# Altium schematic symbol library GN-1846-E-V2_Library.SchLib: 99 symbols (part 2 of 7)
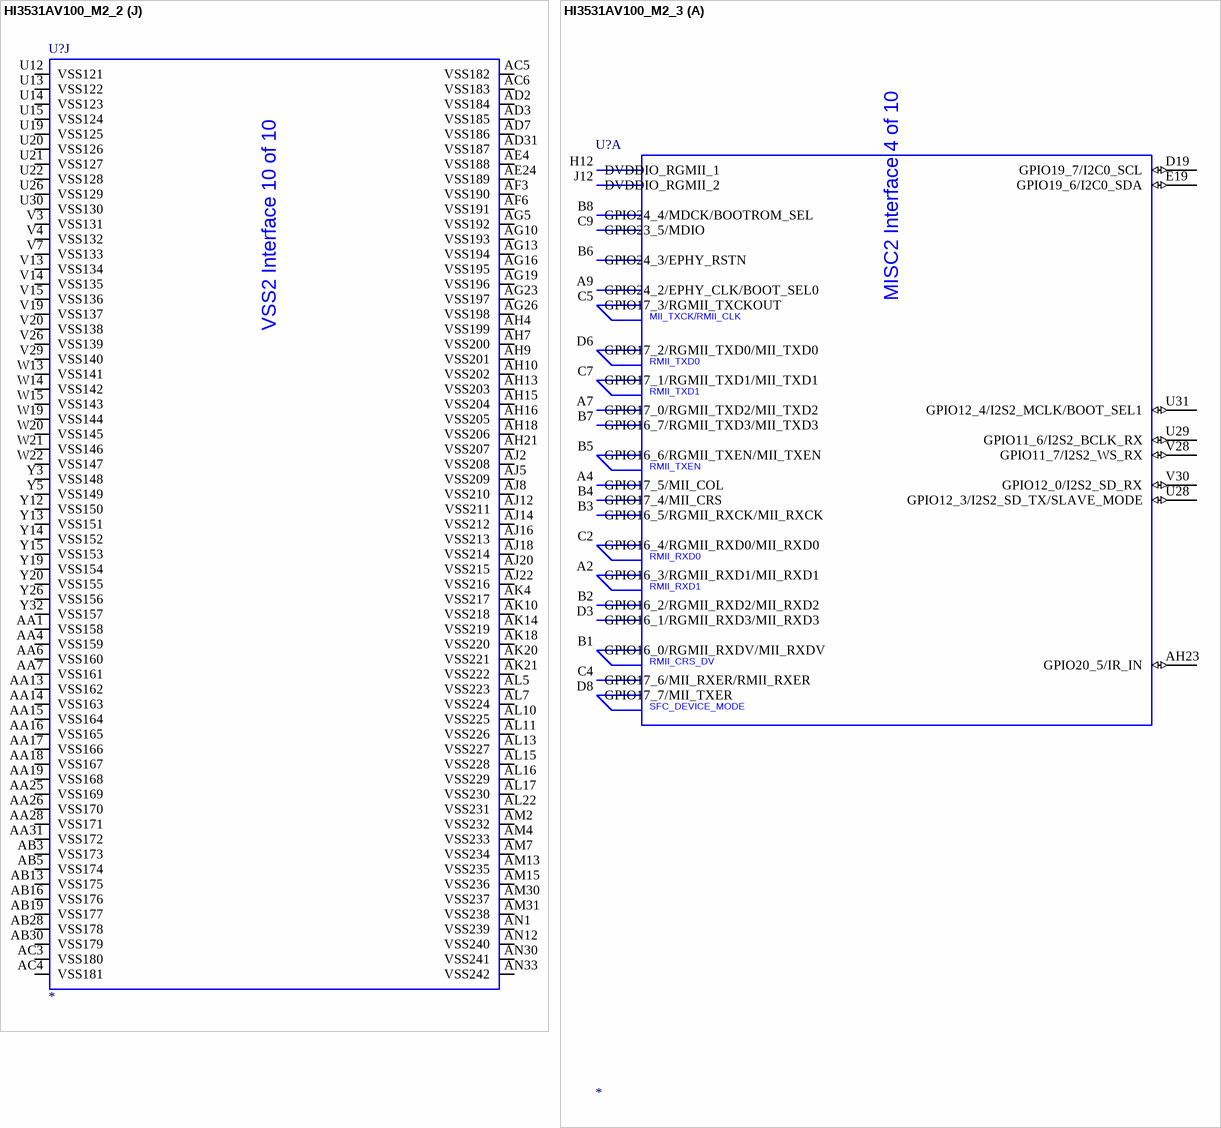
[diagram p78: symbols HI3531AV100_M2_2 to HI3531AV100_M2_3]

## HI3531AV100_M2_2
designator U?
PARTS: 1; OriginalSymbolOrigin: (30,630); LEVEL: STD; DEVICE: HI3531AV100; HETERO: (HI3531AV100_DDR1),(HI3531AV100_DDR2),(HI3531AV100_SYSTEM),(HI3531AV100_AD),(HI3531AV100_VO),(HI3531AV100_M1),(HI3531AV100_M2),(HI3531AV100_POWER),(HI3531AV100_VSS1),(HI3531AV100_VSS2); FORWARD_PCB: 1
part A pins: A2 GPIO16_3/RGMII_RXD1/MII_RXD1 (io), A4 GPIO17_5/MII_COL (io), A7 GPIO17_0/RGMII_TXD2/MII_TXD2 (io), A9 GPIO24_2/EPHY_CLK/BOOT_SEL0 (io), AH23 GPIO20_5/IR_IN (io), B1 GPIO16_0/RGMII_RXDV/MII_RXDV (io), B2 GPIO16_2/RGMII_RXD2/MII_RXD2 (io), B3 GPIO16_5/RGMII_RXCK/MII_RXCK (io), B4 GPIO17_4/MII_CRS (io), B5 GPIO16_6/RGMII_TXEN/MII_TXEN (io), B6 GPIO24_3/EPHY_RSTN (io), B7 GPIO16_7/RGMII_TXD3/MII_TXD3 (io), B8 GPIO24_4/MDCK/BOOTROM_SEL (io), C2 GPIO16_4/RGMII_RXD0/MII_RXD0 (io), C4 GPIO17_6/MII_RXER/RMII_RXER (io), C5 GPIO17_3/RGMII_TXCKOUT (io), C7 GPIO17_1/RGMII_TXD1/MII_TXD1 (io), C9 GPIO23_5/MDIO (io), D3 GPIO16_1/RGMII_RXD3/MII_RXD3 (io), D6 GPIO17_2/RGMII_TXD0/MII_TXD0 (io), D8 GPIO17_7/MII_TXER (io), D19 GPIO19_7/I2C0_SCL (io), E19 GPIO19_6/I2C0_SDA (io), H12 DVDDIO_RGMII_1 (io), J12 DVDDIO_RGMII_2 (io), U28 GPIO12_3/I2S2_SD_TX/SLAVE_MODE (io), U29 GPIO11_6/I2S2_BCLK_RX (io), U31 GPIO12_4/I2S2_MCLK/BOOT_SEL1 (io), V28 GPIO11_7/I2S2_WS_RX (io), V30 GPIO12_0/I2S2_SD_RX (io)
part B pins: A13 HDMI_TX1P (io), A15 HDMI_TXCP (io), A16 AVSS_HDMITX1 (io), A17 VGA_G (io), A18 VGA_B (io), A21 GPIO10_4/VOU1120_DAT12 (io), A22 GPIO10_2/VOU1120_DAT10 (io), AJ24 GPIO23_7/UART3_TXD (io), AK25 GPIO23_6/UART3_RXD (io), B13 HDMI_TX1N (io), B15 HDMI_TXCN (io), B16 AVSS_HDMITX2 (io), B17 VGA_R (io), B18 AVSS_VDAC1 (io), B20 GPIO10_7/VOU1120_DAT15 (io), B21 GPIO10_5/VOU1120_DAT13 (io), B22 GPIO10_1/VOU1120_DAT9 (io), B23 GPIO10_0/VOU1120_DAT8 (io), C12 HDMI_TX2P (io), C13 AVSS_HDMITX3 (io), C14 HDMI_TX0P (io), C15 AVSS_HDMITX4 (io), C16 GPIO14_4/HDMI_HOTPLUG (io), C18 CVBS_OUT (io), C19 AVSS_VDAC2 (io), C20 GPIO10_6/VOU1120_DAT14 (io), C21 GPIO10_3/VOU1120_DAT11 (io), C23 GPIO20_7/VOU1120_CLK (io), D12 HDMI_TX2N (io), D13 AVSS_HDMITX5 (io), D14 HDMI_TX0N (io), D15 AVSS_HDMITX6 (io), D16 GPIO14_6/HDMI_SDA (io), D17 GPIO24_0/VGA_HS (io), D18 AVSS_VDAC3 (io), D20 GPIO9_7/VOU1120_DAT7/UART1_TXD (io), D22 GPIO9_1/VOU1120_DAT1/UART0_TXD (io), D23 GPIO9_0/VOU1120_DAT0/UART0_RXD (io), D24 GPIO12_7/I2S3_SD_TX (io), E2 GPIO0_1/VOU_SLV_DAT1 (io), E3 GPIO0_6/VOU_SLV_CLK (io), E12 AVSS_HDMITX7 (io), E13 AVSS_HDMITX8 (io), E14 AVSS_HDMITX9 (io), E15 GPIO14_5/HDMI_CEC (io), E16 GPIO14_7/HDMI_SCL (io), E17 GPIO24_1/VGA_VS (io), E18 AVSS_VDAC4 (io), E20 GPIO9_6/VOU1120_DAT6/UART1_RXD (io), E21 GPIO9_5/VOU1120_DAT5/UART1_CTSN (io), E22 GPIO9_2/VOU1120_DAT2/UART2_RXD (io), E23 GPIO9_3/VOU1120_DAT3/UART2_TXD (io), E24 GPIO12_6/I2S3_WS_TX (io), F1 GPIO13_7/VOU_SLV_DAT3 (io), F2 UART0_TXD/VOU_SLV_DAT4/GPIO18_1 (io), F3 GPIO0_7/VOU_SLV_DAT2 (io), F18 VDAC_REXT (io), F22 GPIO9_4/VOU1120_DAT4/UART1_RTSN (io), F24 GPIO12_5/I2S3_BCLK_TX (io), G1 UART0_RXD/VOU_SLV_DAT5/GPIO18_0 (io), G2 GPIO18_5/VOU_SLV_DAT6/UART1_TXD (io), G3 GPIO0_2/VOU_SLV_DAT0 (io), H2 GPIO18_4/VOU_SLV_DAT7/UART1_RXD (io), H3 GPIO0_3/VOU_SLV_DAT9 (io), H15 AVSS_HDMITX10 (io), H16 AVSS_HDMITX11 (io), H18 AVSS_VDAC5 (io), H19 AVSS_VDAC6 (io), H20 DVSS_VDAC (io), J1 GPIO18_7/VOU_SLV_DAT13 (io), J2 GPIO18_6/VOU_SLV_DAT12 (io), J3 GPIO18_3/VOU_SLV_DAT10 (io), J15 AVDD33_HDMITX (io), J16 AVCC11_HDMITX (io), J18 AVSS_VDAC_0 (io), J19 AVDD33_VDAC (io), J20 DVDD33_VDAC (io), K1 GPIO0_0/VOU_SLV_DAT15 (io), K2 GPIO0_4/VOU_SLV_DAT14 (io), K3 GPIO18_2/VOU_SLV_DAT11 (io), L3 GPIO0_5/VOU_SLV_DAT8 (io)
part C pins: A24 VI0_DAT0/GPIO1_0 (io), A25 VI0_DAT2/GPIO1_2 (io), A27 VI1_DAT2/GPIO2_2 (io), A28 VI2_CLK/GPIO21_3/VI_ADC_REFCLK1 (io), A29 VI2_DAT1/GPIO3_1 (io), A30 VI2_DAT3/GPIO3_3 (io), A31 VI2_DAT5/GPIO3_5 (io), A32 VI3_CLK/GPIO21_4/VI2_CLK (io), B24 VI0_CLK/GPIO21_0/VI_ADC_REFCLK0 (io), B25 VI0_DAT3/GPIO1_3 (io), B26 VI1_CLK/GPIO21_1/VI0_CLK (io), B27 VI1_DAT1/GPIO2_1 (io), B29 VI2_DAT0/GPIO3_0 (io), B30 VI2_DAT4/GPIO3_4 (io), B31 VI2_DAT6/GPIO3_6 (io), B32 VI3_DAT1/GPIO4_1 (io), B33 VI3_DAT2/GPIO4_2 (io), C25 VI0_DAT1/GPIO1_1 (io), C27 VI1_DAT0/GPIO2_0 (io), C28 GPIO21_2/VI_ADC_REFCLK0/VI1_CLK (io), C30 VI2_DAT2/GPIO3_2 (io), C31 VI3_DAT0/GPIO4_0 (io), C32 VI3_DAT3/GPIO4_3 (io), C33 VI3_DAT4/GPIO4_4 (io), D25 VI0_DAT4/GPIO1_4 (io), D27 VI1_DAT4/GPIO2_4 (io), D28 VI1_DAT6/GPIO2_6 (io), D29 VI2_DAT7/GPIO3_7 (io), D30 GPIO11_1/I2S0_WS_RX (io), D31 VI3_DAT5/GPIO4_5 (io), D32 VI3_DAT6/GPIO4_6 (io), E25 VI0_DAT5/GPIO1_5 (io), E26 VI0_DAT6/GPIO1_6 (io), E27 VI1_DAT3/GPIO2_3 (io), E28 VI1_DAT7/GPIO2_7 (io), E29 GPIO11_2/I2S0_SD_RX (io), E31 VI3_DAT7/GPIO4_7 (io), E32 GPIO21_5/VI_ADC_REFCLK1/VI3_CLK (io), F26 VI0_DAT7/GPIO1_7 (io), F27 VI1_DAT5/GPIO2_5 (io), F28 GPIO11_0/I2S0_BCLK_RX (io), F29 VI4_DAT1/GPIO5_1 (io), F30 VI4_DAT0/GPIO5_0 (io), F31 VI4_CLK/GPIO21_6/VI_ADC_REFCLK2 (io), F32 VI4_DAT5/GPIO5_5 (io), F33 VI4_DAT4/GPIO5_4 (io), G28 VI4_DAT2/GPIO5_2 (io), G29 VI4_DAT3/GPIO5_3 (io), G30 VI5_DAT0/GPIO6_0 (io), G32 VI4_DAT6/GPIO5_6 (io), H29 VI5_DAT1/GPIO6_1 (io), H30 VI5_DAT2/GPIO6_2 (io), H31 VI4_DAT7/GPIO5_7 (io), H32 VI5_CLK/GPIO21_7/VI4_CLK (io), J28 VI5_DAT3/GPIO6_3 (io), J29 VI5_DAT4/GPIO6_4 (io), J30 VI5_DAT5/GPIO6_5 (io), J31 GPIO12_1/VI_ADC_REFCLK2/VI5_CLK (io), J32 VI5_DAT7/GPIO6_7 (io), J33 VI5_DAT6/GPIO6_6 (io), K25 DVDD3318_VI_1 (io), K28 GPIO11_3/I2S1_BCLK_RX (io), K29 GPIO11_4/I2S1_WS_RX (io), K32 VI6_CLK/GPIO12_2/VI_ADC_REFCLK3 (io), L25 DVDD3318_VI_2 (io), L29 GPIO11_5/I2S1_SD_RX (io), L30 VI6_DAT0/GPIO7_0 (io), L31 VI6_DAT4/GPIO7_4 (io), L32 VI6_DAT6/GPIO7_6 (io), L33 VI6_DAT5/GPIO7_5 (io), M25 DVDD3318_VI_3 (io), M28 VI6_DAT1/GPIO7_1 (io), M29 VI6_DAT2/GPIO7_2 (io), M32 VI7_CLK/GPIO15_7/VI6_CLK (io), M33 VI6_DAT7/GPIO7_7 (io), N25 DVDD3318_VI_4 (io), N28 VI6_DAT3/GPIO7_3 (io), N29 VI7_DAT0/GPIO8_0 (io), N30 VI7_DAT1/GPIO8_1 (io), N31 VI7_DAT5/GPIO8_5 (io), N32 VI7_DAT6/GPIO8_6 (io), P25 DVDD3318_VI_5 (io), P28 VI7_DAT4/GPIO8_4 (io), P29 VI7_DAT2/GPIO8_2 (io), P30 VI7_DAT3/GPIO8_3 (io), P31 VI7_DAT7/GPIO8_7 (io), P33 GPIO20_6/VI_ADC_REFCLK3/VI7_CLK (io), R25 DVDD3318_VI_6 (io), R29 SPI_CSN0/PCIE_SATA_MODE0 (io), R31 GPIO13_0/SPI_SCLK/I2C1_SCL (io), R32 GPIO13_2/SPI_SDI (io), R33 TEST_CLK/SPI_SDO/I2C1_SDA (io), T28 SPI_CSN3/PCIE_SATA_MODE3 (io), T29 SPI_CSN1/PCIE_SATA_MODE1 (io), T30 SPI_CSN2/PCIE_SATA_MODE2 (io)
part D pins: A10 GPIO14_0/USB2_OVRCUR (io), A11 USB2_DP (io), AA20 AVSS_SATA0_1 (io), AA21 AVSS_SATA2_1 (io), AA22 AVDD_SATA2 (io), AB20 AVDD_SATA0 (io), AB21 AVDD_SATA1 (io), AB22 AVSS_SATA1_1 (io), AC25 AVDD33_SATA3 (io), AC26 AVSS_SATA3_2 (io), AD22 AVDD33_SATA0 (io), AD23 AVDD33_SATA1 (io), AD25 AVDD33_SATA2 (io), AD26 AVSS_SATA2_2 (io), AE22 AVSS_SATA0_2 (io), AE23 AVSS_SATA1_2 (io), AE29 AVSS_SATA3_3 (io), AE30 AVSS_SATA3_4 (io), AF28 AVSS_SATA3_5 (io), AF29 SATA_TX3P/PCIE0_TX0P (io), AF30 SATA_TX3M/PCIE0_TX0M (io), AF31 AVSS_SATA3_6 (io), AF32 SATA_RX3P/PCIE0_RX0P (io), AF33 SATA_RX3M/PCIE0_RX0M (io), AG24 AVDD33_USB3 (io), AG25 AVSS_USB3_1 (io), AG28 AVSS_SATA2_3 (io), AG29 AVSS_SATA2_4 (io), AG30 AVSS_SATA2_5 (io), AH25 USB3_REXT (io), AH26 GPIO14_3/USB3_PWREN (io), AH27 GPIO14_2/USB3_OVRCUR (io), AH28 AVSS_SATA1_3 (io), AH29 SATA_TX2P/PCIE1_TX0P/PCIE0_TX1P (io), AH30 SATA_TX2M/PCIE1_TX0M/PCIE0_TX1M (io), AH31 AVSS_SATA2_6 (io), AH32 SATA_RX2P/PCIE1_RX0P/PCIE0_RX1P (io), AH33 SATA_RX2M/PCIE1_RX0M/PCIE0_RX1M (io), AJ25 AVSS_SATA0_3 (io), AJ26 SATA_TX0P/PCIE1_TX1P/USB3_TXP (io), AJ27 AVSS_SATA0_4 (io), AJ28 SATA_TX1P/PCIE1_TX0P (io), AJ29 AVSS_SATA1_4 (io), AJ30 AVSS_SATA2_7 (io), AK26 SATA_TX0M/PCIE1_TX1M/USB3_TXM (io), AK27 AVSS_SATA0_5 (io), AK28 SATA_TX1M/PCIE1_TX0M (io), AK29 AVSS_SATA1_5 (io), AK30 AVSS_SATA2_8 (io), AK31 AVSS_SATA2_9 (io), AK32 PCIE_REFCLK0P (io), AK33 PCIE_REFCLK0M (io), AL24 AVSS_USB3_2 (io), AL26 AVSS_SATA0_6 (io), AL28 AVSS_SATA1_6 (io), AL30 PCIE_REFCLK1P (io), AL31 PCIE_REFCLK1M (io), AM24 USB3_DP (io), AM26 SATA_RX0P/PCIE1_RX1P/USB3_RXP (io), AM28 SATA_RX1P/PCIE1_RX0P (io), AM32 GPIO15_2/SATA_LED_N2 (io), AM33 GPIO15_3/SATA_LED_N3 (io), AN24 USB3_DM (io), AN26 SATA_RX0M/PCIE1_RX1M/USB3_RXM (io), AN28 SATA_RX1M/PCIE1_RX0M (io), AN31 GPIO15_0/SATA_LED_N0 (io), AN32 GPIO15_1/SATA_LED_N1 (io), B10 GPIO14_1/USB2_PWREN (io), B11 USB2_DM (io), C11 AVSS_USB2_1 (io), D10 AVSS_USB2_2 (io), D11 USB2_REXT (io), H14 AVSS_USB2_3 (io), J14 AVDD33_USB2 (io), Y21 AVSS_SATA3_1 (io), Y22 AVDD_SATA3 (io)
part E pins: AA29 RSTN (io), AA30 NF_DQ0/VI8_DAT14/GPIO22_0 (io), AA32 XIN (io), AA33 XOUT (io), AB25 AVDD33_RTC (io), AB26 AVSS_RTC1 (io), AB29 WDG_RSTN/SYS_RSTN_OUT (io), AB31 RTC_XIN (io), AB32 RTC_XOUT (io), AC28 SFC_HOLD_IO3/GPIO19_3 (io), AC29 SFC_DOI/GPIO19_2 (io), AC30 SFC_WP_IO2/GPIO19_1 (io), AC31 AVSS_RTC2 (io), AC32 AVSS_RTC3 (io), AD28 AVSS_RTC4 (io), AD29 SFC_CLK/GPIO24_5/SFC_BOOT_MODE (io), AD30 SFC_DIO/GPIO19_0 (io), AD32 SFC_CS1N/GPIO19_5 (io), AD33 SFC_CS0N/GPIO19_4 (io), AE28 AVDD_BAT (io), AG27 AVDD_EFUSE (io), AH22 TEST_MODE (io), AH24 POR_ENABLE (io), AJ23 JTAG_TRSTN/GPIO20_0 (io), AK22 JTAG_EN (io), AK23 JTAG_TCK/GPIO20_1 (io), AK24 JTAG_TDI/GPIO20_4 (io), AL23 JTAG_TMS/GPIO20_2 (io), AM23 JTAG_TDO/GPIO20_3 (io), C1 PWM_OUT0/GPIO15_4 (io), D1 PWM_OUT2/GPIO15_6 (io), D2 PWM_OUT1/GPIO15_5 (io), T32 NF_RDY1/VI8_CLK/GPIO23_2 (io), U32 NF_RDY0/VI8_DAT1/GPIO23_1 (io), U33 NF_REN/VI8_DAT2/GPIO13_5 (io), V31 NF_CLE/VI8_DAT5/GPIO13_3 (io), V32 NF_CSN0/VI8_DAT3/GPIO23_3 (io), V33 NF_CSN1/VI8_DAT4/GPIO23_4 (io), W28 NF_DQ7/VI8_DAT7/GPIO22_7 (io), W29 NF_DQ5/VI8_DAT9/GPIO22_5 (io), W30 NF_DQ4/VI8_DAT10/GPIO22_4 (io), W31 NF_DQ6/VI8_DAT8/GPIO22_6 (io), W32 NF_WEN/VI8_DAT0/GPIO13_6 (io), W33 NF_ALE/VI8_DAT6/GPIO13_4 (io), Y25 DVDDIO_SFC (io), Y28 NF_DQ1/VI8_DAT13/GPIO22_1 (io), Y29 NF_DQ3/VI8_DAT11/GPIO22_3 (io), Y30 NF_DQ2/VI8_DAT12/GPIO22_2 (io), Y31 GPIO23_0/VI8_DAT15 (io)
part F pins: AB14 AVDD_DDRPLL3 (io), AB15 AVSS_DDRPLL3 (io), AB17 AVDD_DDRPLL4 (io), AB18 AVSS_DDRPLL4 (io), AG8 VDDIO_DDR11 (io), AG9 VDDIO_DDR12 (io), AG11 VDDIO_DDR13 (io), AG12 VDDIO_DDR14 (io), AG14 VDDIO_DDR15 (io), AG15 VDDIO_CK_DDR1 (io), AG17 VDDIO_DDR16 (io), AG18 VDDIO_DDR17 (io), AG20 VDDIO_DDR18 (io), AG21 DDR1_ZQ (io), AH5 VDDIO_DDR19 (io), AH6 VDDIO_DDR20 (io), AH8 DDR1_DM0 (io), AH11 DDR1_DQ25 (io), AH12 DDR1_DQ17 (io), AH14 DDR1_DQ24 (io), AH17 DDR1_A0 (io), AH19 DDR1_A4 (io), AH20 DDR1_A8 (io), AJ6 DDR1_DQ6 (io), AJ7 DDR1_DQ7 (io), AJ9 DDR1_DQ10 (io), AJ10 DDR1_DQ20 (io), AJ11 DDR1_DQ16 (io), AJ13 DDR1_DQ19 (io), AJ15 DDR1_WE_N (io), AJ17 DDR1_A12 (io), AJ19 DDR1_A6 (io), AJ21 DDR1_A14 (io), AK5 DDR1_DQ2 (io), AK6 DDR1_DQ4 (io), AK7 DDR1_DQ1 (io), AK8 DDR1_DQ8 (io), AK9 DDR1_DQ14 (io), AK11 DDR1_DM3 (io), AK12 DDR1_DQ23 (io), AK13 DDR1_DM2 (io), AK15 DDR1_CAS_N (io), AK16 DDR1_A10 (io), AK17 DDR1_A15 (io), AK19 DDR1_A1 (io), AL3 DDR1_DQ13 (io), AL4 DDR1_DQ0 (io), AL6 DDR1_DQS1_N (io), AL8 DDR1_DQ22 (io), AL9 DDR1_DQ29 (io), AL12 DDR1_DQS3_N (io), AL14 DDR1_DQ30 (io), AL18 DDR1_ODT (io), AL19 DDR1_A11 (io), AL20 DDR1_A5 (io), AL21 DDR1_A7 (io), AM3 DDR1_DQ9 (io), AM5 DDR1_DQS0_N (io), AM6 DDR1_DQS1_P (io), AM8 DDR1_DQ3 (io), AM9 DDR1_DQ18 (io), AM10 DDR1_DQ31 (io), AM11 DDR1_DQS2_N (io), AM12 DDR1_DQS3_P (io), AM14 DDR1_DQ26 (io), AM16 DDR1_CLK_P (io), AM17 DDR1_CKE (io), AM18 DDR1_RAS_N (io), AM19 DDR1_A3 (io), AM20 DDR1_A2 (io), AM21 DDR1_RESET_N (io), AM22 DDR1_A13 (io), AN2 DDR1_DQ11 (io), AN3 DDR1_DQ15 (io), AN4 DDR1_DM1 (io), AN5 DDR1_DQS0_P (io), AN7 DDR1_DQ12 (io), AN8 DDR1_DQ5 (io), AN10 DDR1_DQ27 (io), AN11 DDR1_DQS2_P (io), AN14 DDR1_DQ28 (io), AN15 DDR1_DQ21 (io), AN16 DDR1_CLK_N (io), AN17 DDR1_BA1 (io), AN18 DDR1_CS_N (io), AN19 DDR1_BA2 (io), AN21 DDR1_A9 (io), AN22 DDR1_BA0 (io)
part G pins: AA2 DDR0_DQS3_P (io), AA3 DDR0_DQS3_N (io), AA5 DDR0_DM2 (io), AA12 AVDD_DDRPLL2 (io), AB2 DDR0_DQ26 (io), AB4 DDR0_DQ24 (io), AB6 DDR0_DQ19 (io), AB7 VDDIO_DDR5 (io), AB12 AVSS_DDRPLL2 (io), AC1 DDR0_DQ28 (io), AC2 DDR0_DQ30 (io), AC7 VDDIO_DDR6 (io), AD1 DDR0_DQ21 (io), AD4 DDR0_WE_N (io), AD5 DDR0_CAS_N (io), AD6 DDR0_A10 (io), AE1 DDR0_CLK_N (io), AE2 DDR0_CLK_P (io), AE3 DDR0_A0 (io), AE5 DDR0_A12 (io), AE6 DDR0_A15 (io), AE7 VDDIO_DDR7 (io), AF1 DDR0_BA1 (io), AF2 DDR0_CKE (io), AF4 DDR0_A4 (io), AF5 DDR0_A6 (io), AF7 VDDIO_DDR8 (io), AG1 DDR0_CS_N (io), AG2 DDR0_RAS_N (io), AG3 DDR0_A1 (io), AG4 DDR0_A11 (io), AG6 VDDIO_DDR9 (io), AG7 VDDIO_DDR10 (io), AH1 DDR0_BA2 (io), AH2 DDR0_ODT (io), AH3 DDR0_A3 (io), AJ1 DDR0_A5 (io), AJ3 DDR0_A8 (io), AJ4 DDR0_A14 (io), AK1 DDR0_A7 (io), AK2 DDR0_A2 (io), AK3 DDR0_A9 (io), AL1 DDR0_RESET_N (io), AL2 DDR0_BA0 (io), AM1 DDR0_A13 (io), M1 DDR0_DQ13 (io), M2 DDR0_DQ15 (io), M5 DDR0_DQ0 (io), M6 DDR0_DQ11 (io), N1 DDR0_DQ9 (io), N3 DDR0_DM1 (io), N4 DDR0_DQ6 (io), N5 DDR0_DQ2 (io), N7 DDR0_ZQ (io), P1 DDR0_DQS0_P (io), P2 DDR0_DQS0_N (io), P4 DDR0_DQ7 (io), P6 DDR0_DQ4 (io), P7 VDDIO_DDR1 (io), R2 DDR0_DQS1_P (io), R3 DDR0_DQS1_N (io), R4 DDR0_DM0 (io), R5 DDR0_DQ1 (io), T2 DDR0_DQ12 (io), T5 DDR0_DQ8 (io), T7 VDDIO_DDR2 (io), U1 DDR0_DQ14 (io), U3 DDR0_DQ5 (io), U4 DDR0_DQ10 (io), U6 DDR0_DQ3 (io), U7 VDDIO_DDR3 (io), V1 DDR0_DQ22 (io), V2 DDR0_DQ18 (io), V5 DDR0_DQ25 (io), V6 DDR0_DQ20 (io), V12 AVDD_DDRPLL1 (io), W2 DDR0_DQ27 (io), W3 DDR0_DQ29 (io), W4 DDR0_DQ31 (io), W5 DDR0_DQ16 (io), W6 DDR0_DM3 (io), W7 VDDIO_CK_DDR0 (io), W12 AVSS_DDRPLL1 (io), Y1 DDR0_DQS2_P (io), Y2 DDR0_DQS2_N (io), Y4 DDR0_DQ17 (io), Y6 DDR0_DQ23 (io), Y7 VDDIO_DDR4 (io)
part H pins: AD24 DVDD33_9 (io), AG22 DVDD33_10 (io), E7 DVDD33_1 (io), F5 DVDD_CPU1 (io), F6 DVDD_CPU2 (io), G5 DVDD_CPU3 (io), G6 DVDD_CPU4 (io), G7 DVDD_CPU5 (io), H5 DVDD_CPU6 (io), H6 DVDD_CPU7 (io), H7 DVDD_CPU8 (io), J5 DVDD_CPU9 (io), J6 DVDD_CPU10 (io), J7 DVDD_CPU11 (io), J13 DVDD33_2 (io), J17 DVDD33_3 (io), J21 DVDD33_4 (io), J22 DVDD33_5 (io), L7 DVDD33_6 (io), M12 DVDD_CPU12 (io), M13 DVDD_CPU13 (io), M16 DVDD_CORE1 (io), M17 DVDD_CORE2 (io), M18 DVDD_CORE3 (io), N12 DVDD_CPU14 (io), N13 DVDD_CPU15 (io), N16 DVDD_CORE4 (io), N17 DVDD_CORE5 (io), N18 DVDD_CORE6 (io), P16 DVDD_CORE7 (io), P17 DVDD_CORE8 (io), P18 DVDD_CORE9 (io), R16 DVDD_CORE10 (io), R17 DVDD_CORE11 (io), R18 DVDD_CORE12 (io), T16 DVDD_CORE13 (io), T17 DVDD_CORE14 (io), T18 DVDD_CORE15 (io), U16 DVDD_CORE16 (io), U17 DVDD_CORE17 (io), U18 DVDD_CORE18 (io), U25 DVDD33_7 (io), V16 DVDD_CORE19 (io), V17 DVDD_CORE20 (io), V18 DVDD_CORE21 (io), V21 AVSS_PLL1 (io), V22 AVDD11_PLL (io), V25 DVDD33_8 (io), W16 DVDD_CORE22 (io), W17 DVDD_CORE23 (io), W18 DVDD_CORE24 (io), W25 AVDD33_PLL (io), W26 AVSS_PLL2 (io), Y16 DVDD_CORE25 (io), Y17 DVDD_CORE26 (io), Y18 DVDD_CORE27 (io)
part I pins: A1 VSS1, A33 VSS2, B9 VSS3, B19 VSS4, B28 VSS5, C3 VSS6, C6 VSS7, C8 VSS8, C10 VSS9, C17 VSS10, C22 VSS11, C24 VSS12, C26 VSS13, C29 VSS14, D4 VSS15, D5 VSS16, D7 VSS17, D9 VSS18, D21 VSS19, D26 VSS20, E4 VSS21, E5 VSS22, E6 VSS23, E30 VSS24, E33 VSS25, F4 VSS26, F7 VSS27, F19 VSS28, F20 VSS29, F21 VSS30, F23 VSS31, F25 VSS32, G4 VSS33, G31 VSS34, H4 VSS35, H11 VSS36, H13 VSS37, H17 VSS38, H21 VSS39, H22 VSS40, H28 VSS41, H33 VSS42, J4 VSS43, J11 VSS44, K4 VSS45, K5 VSS46, K6 VSS47, K7 VSS48, K26 VSS49, K30 VSS50, K31 VSS51, L2 VSS52, L4 VSS53, L5 VSS54, L6 VSS55, L26 VSS56, L28 VSS57, M3 VSS58, M4 VSS59, M7 VSS60, M14 VSS61, M15 VSS62, M19 VSS63, M20 VSS64, M21 VSS65, M22 VSS66, M26 VSS67, M30 VSS68, M31 VSS69, N2 VSS70, N6 VSS71, N14 VSS72, N15 VSS73, N19 VSS74, N20 VSS75, N21 VSS76, N22 VSS77, N26 VSS78, P3 VSS79, P5 VSS80, P12 VSS81, P13 VSS82, P14 VSS83, P15 VSS84, P19 VSS85, P20 VSS86, P21 VSS87, P22 VSS88, P26 VSS89, P32 VSS90, R1 VSS91, R6 VSS92, R7 VSS93, R12 VSS94, R13 VSS95, R14 VSS96, R15 VSS97, R19 VSS98, R20 VSS99, R21 VSS100, R22 VSS101, R26 VSS102, R28 VSS103, R30 VSS104, T3 VSS105, T4 VSS106, T6 VSS107, T12 VSS108, T13 VSS109, T14 VSS110, T15 VSS111, T19 VSS112, T20 VSS113, T21 VSS114, T22 VSS115, T25 VSS116, T26 VSS117, T31 VSS118, U2 VSS119, U5 VSS120
part J pins: AA1 VSS158, AA4 VSS159, AA6 VSS160, AA7 VSS161, AA13 VSS162, AA14 VSS163, AA15 VSS164, AA16 VSS165, AA17 VSS166, AA18 VSS167, AA19 VSS168, AA25 VSS169, AA26 VSS170, AA28 VSS171, AA31 VSS172, AB3 VSS173, AB5 VSS174, AB13 VSS175, AB16 VSS176, AB19 VSS177, AB28 VSS178, AB30 VSS179, AC3 VSS180, AC4 VSS181, AC5 VSS182, AC6 VSS183, AD2 VSS184, AD3 VSS185, AD7 VSS186, AD31 VSS187, AE4 VSS188, AE24 VSS189, AF3 VSS190, AF6 VSS191, AG5 VSS192, AG10 VSS193, AG13 VSS194, AG16 VSS195, AG19 VSS196, AG23 VSS197, AG26 VSS198, AH4 VSS199, AH7 VSS200, AH9 VSS201, AH10 VSS202, AH13 VSS203, AH15 VSS204, AH16 VSS205, AH18 VSS206, AH21 VSS207, AJ2 VSS208, AJ5 VSS209, AJ8 VSS210, AJ12 VSS211, AJ14 VSS212, AJ16 VSS213, AJ18 VSS214, AJ20 VSS215, AJ22 VSS216, AK4 VSS217, AK10 VSS218, AK14 VSS219, AK18 VSS220, AK20 VSS221, AK21 VSS222, AL5 VSS223, AL7 VSS224, AL10 VSS225, AL11 VSS226, AL13 VSS227, AL15 VSS228, AL16 VSS229, AL17 VSS230, AL22 VSS231, AM2 VSS232, AM4 VSS233, AM7 VSS234, AM13 VSS235, AM15 VSS236, AM30 VSS237, AM31 VSS238, AN1 VSS239, AN12 VSS240, AN30 VSS241, AN33 VSS242, U12 VSS121, U13 VSS122, U14 VSS123, U15 VSS124, U19 VSS125, U20 VSS126, U21 VSS127, U22 VSS128, U26 VSS129, U30 VSS130, V3 VSS131, V4 VSS132, V7 VSS133, V13 VSS134, V14 VSS135, V15 VSS136, V19 VSS137, V20 VSS138, V26 VSS139, V29 VSS140, W13 VSS141, W14 VSS142, W15 VSS143, W19 VSS144, W20 VSS145, W21 VSS146, W22 VSS147, Y3 VSS148, Y5 VSS149, Y12 VSS150, Y13 VSS151, Y14 VSS152, Y15 VSS153, Y19 VSS154, Y20 VSS155, Y26 VSS156, Y32 VSS157
part A text: MISC2 Interface 4 of 10; MII_TXCK/RMII_CLK; RMII_TXD0; RMII_TXD1; RMII_TXEN; RMII_RXD0; RMII_RXD1; RMII_CRS_DV; SFC_DEVICE_MODE
part B text: PCIE_REFCLK_SEL; UART0_RTSN; UART0_CTSN; VO/AO Interface 7 of 10; COMBPHY_TEST_OUT0; COMBPHY_TEST_OUT1; COMBPHY_TEST_OUT2; COMBPHY_TEST_OUT3; UART1_RTSN/UART0_RTSN; UART1_CTSN/UART0_CTSN; UART2_RXD/UART0_RTSN; UART2_TXD/UART0_CTSN
part C text: GPIO13_1; AD Interface 6 of 10
part D text: MISC1 Interface 3 of 10
part E text: SYSTEM Interface 5 of 10
part F text: DDR2 Interface 2 of 10
part G text: DDR1 Interface 1 of 10
part H text: POWER Interface 8 of 10
part I text: VSS1 Interface 9 of 10
part J text: VSS2 Interface 10 of 10

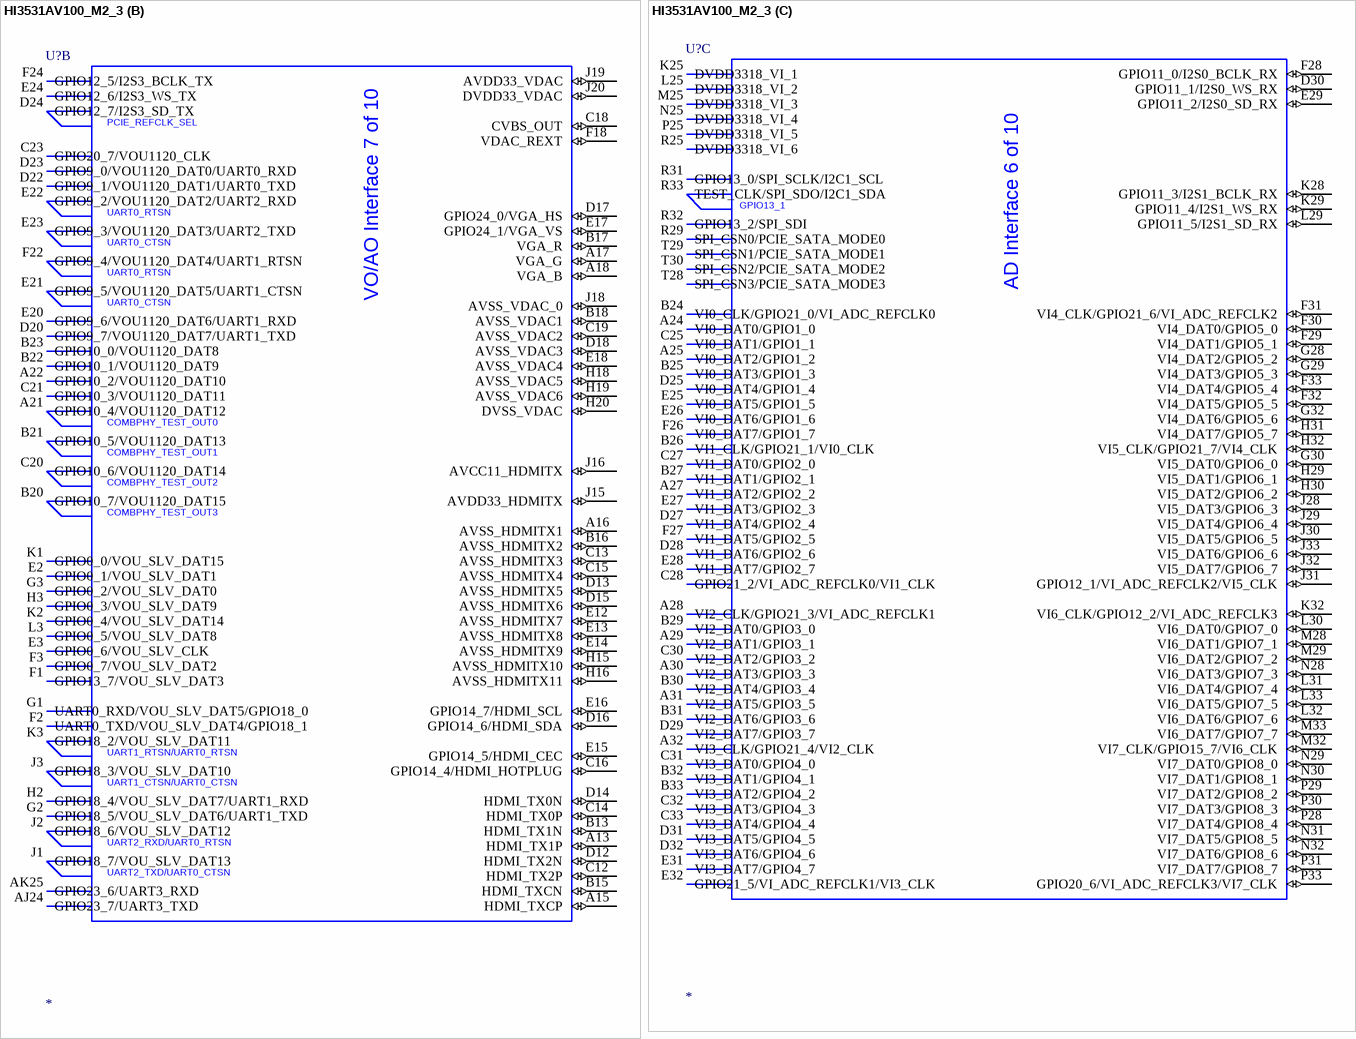
[diagram p15: symbol HI3531AV100_M2_3]

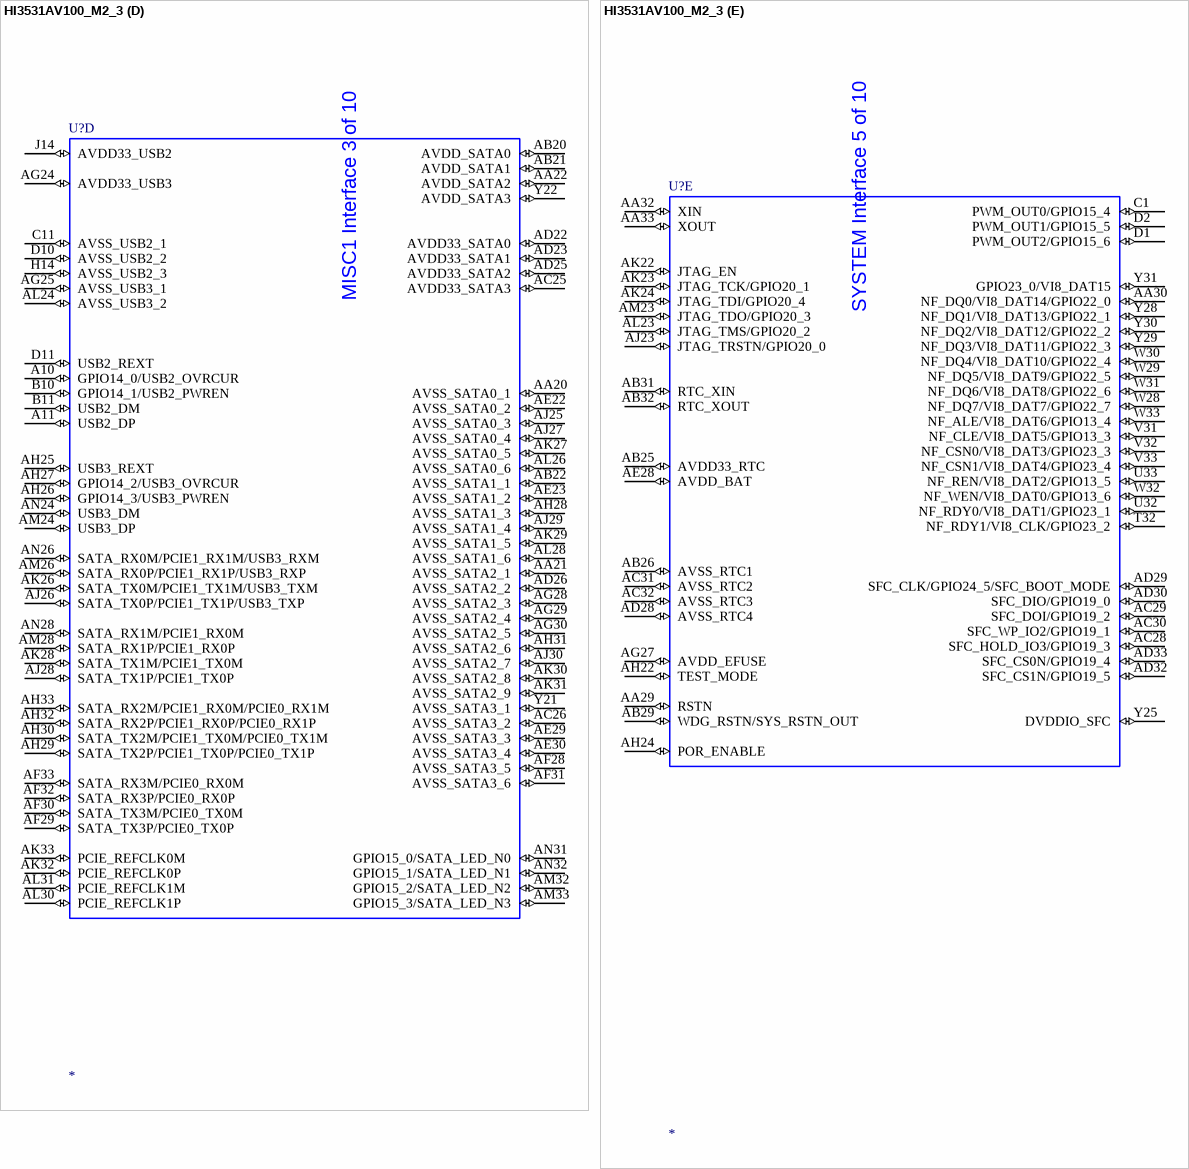
[diagram p16: symbol HI3531AV100_M2_3]

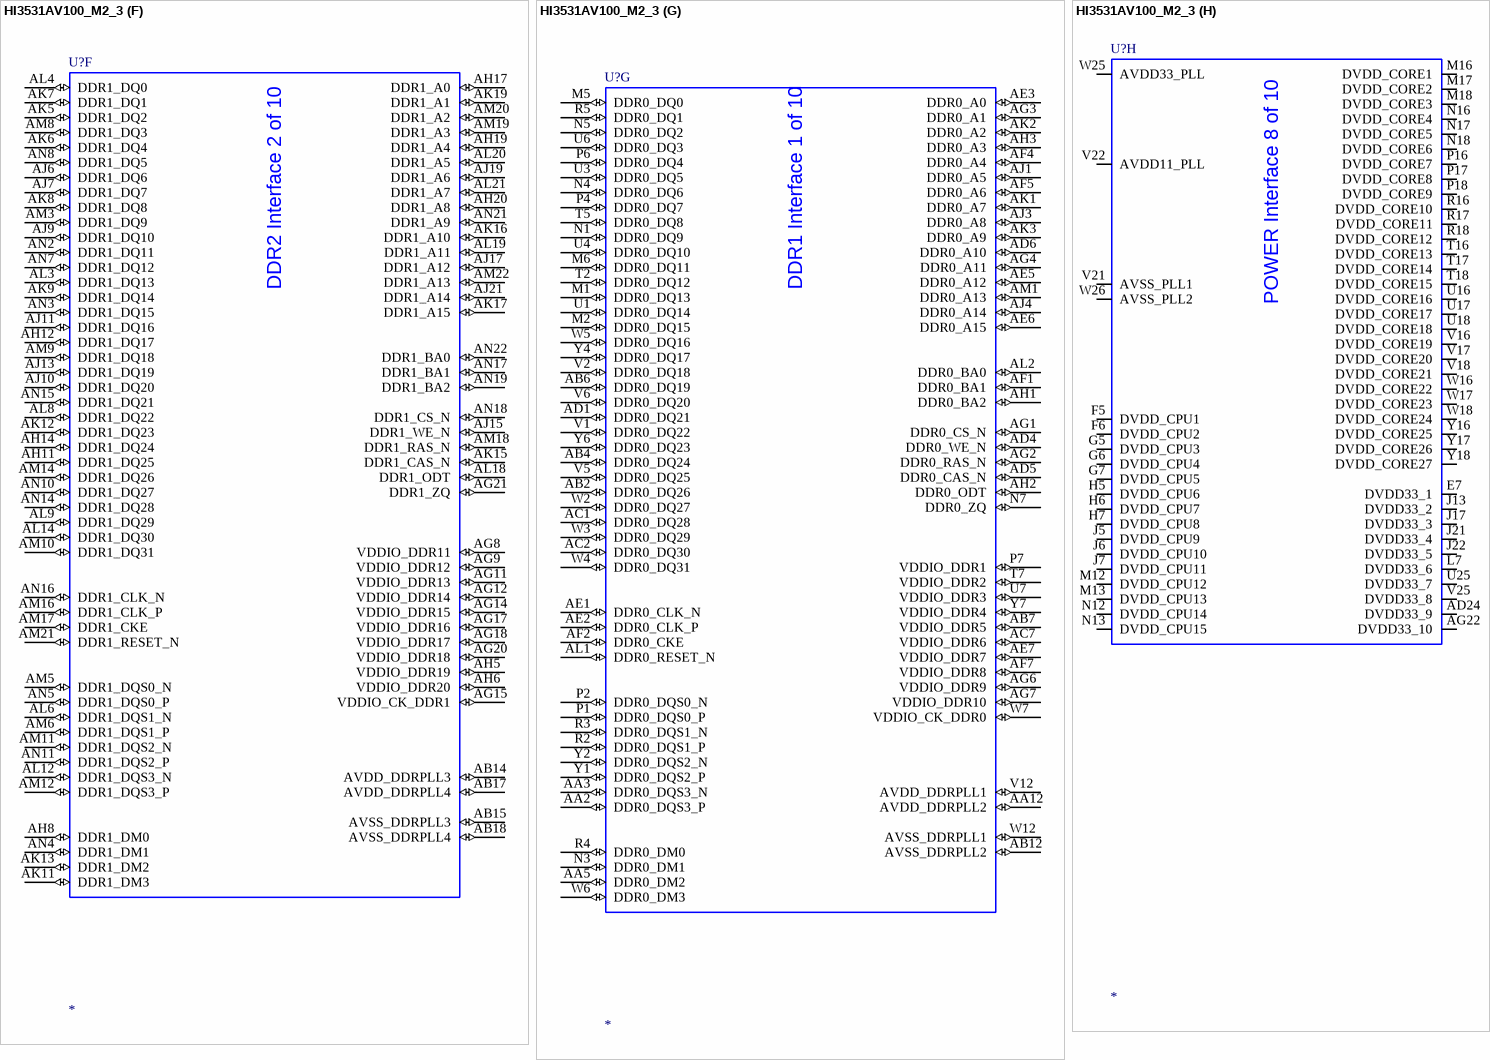
[diagram p17: symbol HI3531AV100_M2_3]

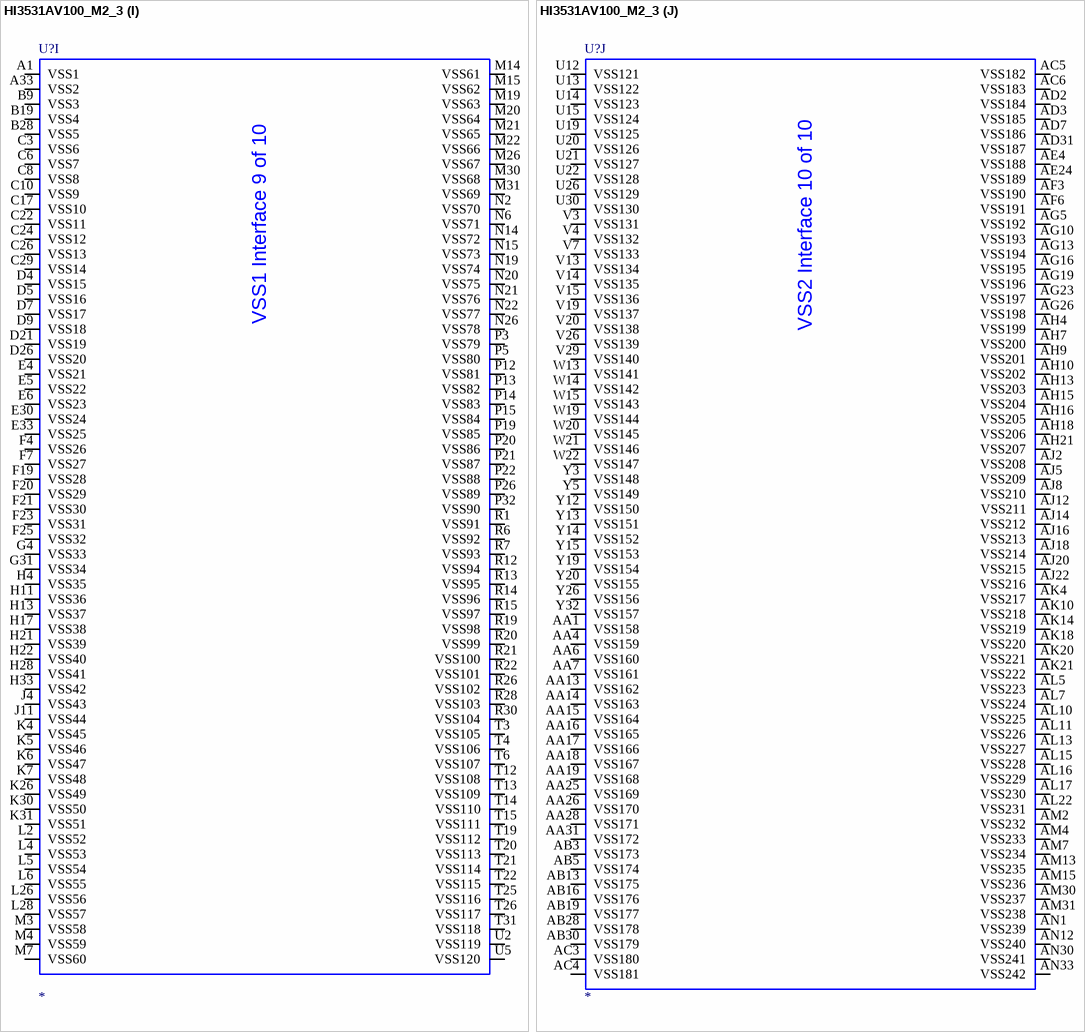
[diagram p18: symbol HI3531AV100_M2_3]
